# Altium footprint library Sockets.PcbLib: 80 footprints (part 6 of 6)
Each footprint in its own frame and in the unit in brackets; x right, y up, seen from the top. Pads: shape width x height; smd on the part's side, far side on the other; paste and mask are expansions set on the pad; w line width, h text height; cw(c..) or ccw(c..) is an arc to the next point about the centre after c.
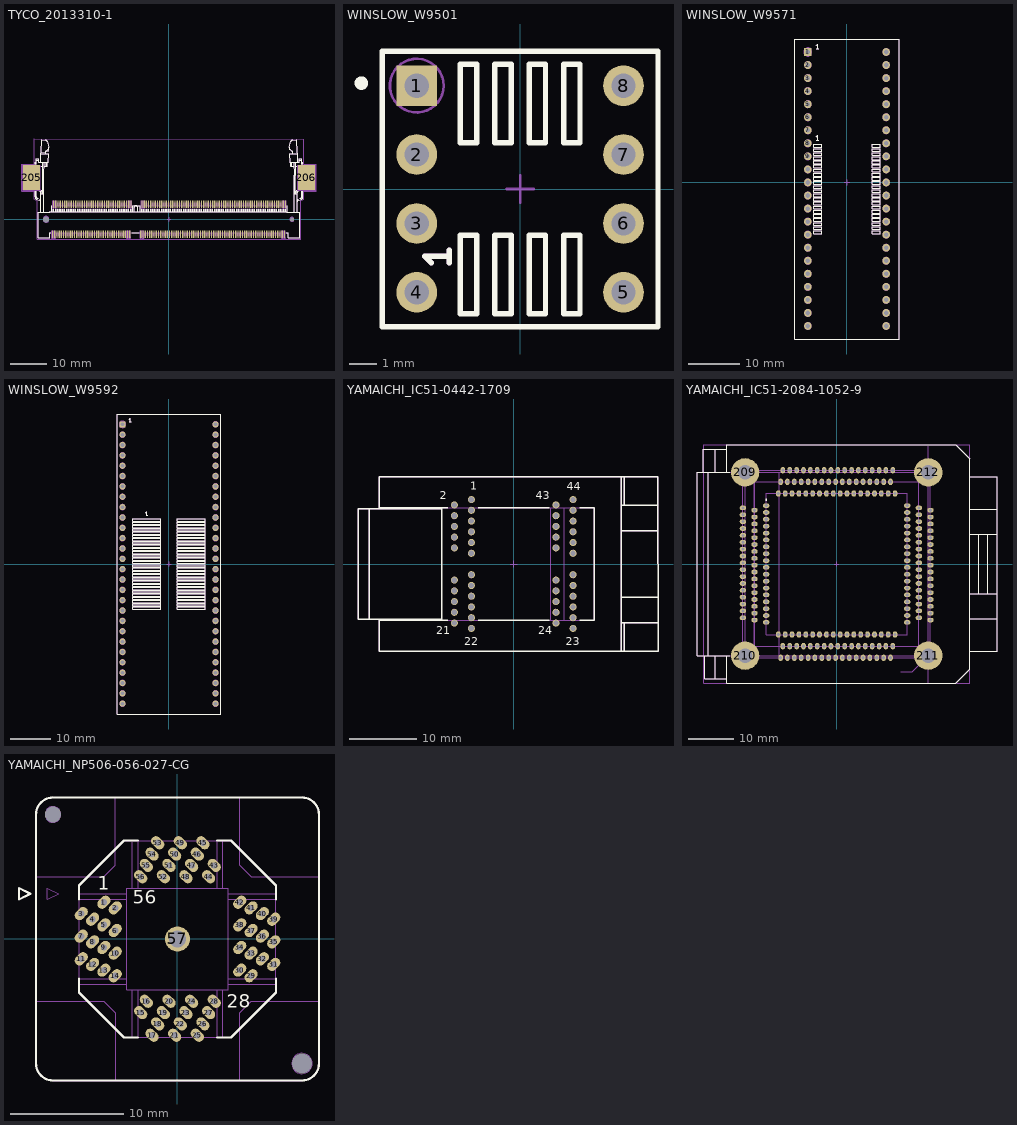
[diagram p5: the footprints below, top view; thin cyan lines are the x and y axes]

## TYCO_2013310-1 [mm] "DDR3 SODIMM Socket 0.6mm Pitch 204 Positions 9.2mm Height"
height 10.2
pads (208):
  rect 0.35x2 smd: 1(-31.65,-4.1) 2(-31.35,4.1) 3(-31.05,-4.1) 4(-30.75,4.1) 5(-30.45,-4.1) 6(-30.15,4.1) 7(-29.85,-4.1) 8(-29.55,4.1) 9(-29.25,-4.1) 10(-28.95,4.1) 11(-28.65,-4.1) 12(-28.35,4.1) 13(-28.05,-4.1) 14(-27.75,4.1) 15(-27.45,-4.1) 16(-27.15,4.1) 17(-26.85,-4.1) 18(-26.55,4.1) 19(-26.25,-4.1) 20(-25.95,4.1) 21(-25.65,-4.1) 22(-25.35,4.1) 23(-25.05,-4.1) 24(-24.75,4.1) 25(-24.45,-4.1) 26(-24.15,4.1) 27(-23.85,-4.1) 28(-23.55,4.1) 29(-23.25,-4.1) 30(-22.95,4.1) 31(-22.65,-4.1) 32(-22.35,4.1) 33(-22.05,-4.1) 34(-21.75,4.1) 35(-21.45,-4.1) 36(-21.15,4.1) 37(-20.85,-4.1) 38(-20.55,4.1) 39(-20.25,-4.1) 40(-19.95,4.1) 41(-19.65,-4.1) 42(-19.35,4.1) 43(-19.05,-4.1) 44(-18.75,4.1) 45(-18.45,-4.1) 46(-18.15,4.1) 47(-17.85,-4.1) 48(-17.55,4.1) 49(-17.25,-4.1) 50(-16.95,4.1) 51(-16.65,-4.1) 52(-16.35,4.1) 53(-16.05,-4.1) 54(-15.75,4.1) 55(-15.45,-4.1) 56(-15.15,4.1) 57(-14.85,-4.1) 58(-14.55,4.1) 59(-14.25,-4.1) 60(-13.95,4.1) 61(-13.65,-4.1) 62(-13.35,4.1) 63(-13.05,-4.1) 64(-12.75,4.1) 65(-12.45,-4.1) 66(-12.15,4.1) 67(-11.85,-4.1) 68(-11.55,4.1) 69(-11.25,-4.1) 70(-10.95,4.1) 71(-10.65,-4.1) 72(-10.35,4.1) 73(-7.65,-4.1) 74(-7.35,4.1) 75(-7.05,-4.1) 76(-6.75,4.1) 77(-6.45,-4.1) 78(-6.15,4.1) 79(-5.85,-4.1) 80(-5.55,4.1) 81(-5.25,-4.1) 82(-4.95,4.1) 83(-4.65,-4.1) 84(-4.35,4.1) 85(-4.05,-4.1) 86(-3.75,4.1) 87(-3.45,-4.1) 88(-3.15,4.1) 89(-2.85,-4.1) 90(-2.55,4.1) 91(-2.25,-4.1) 92(-1.95,4.1) 93(-1.65,-4.1) 94(-1.35,4.1) 95(-1.05,-4.1) 96(-0.75,4.1) 97(-0.45,-4.1) 98(-0.15,4.1) 99(0.15,-4.1) 100(0.45,4.1) 101(0.75,-4.1) 102(1.05,4.1) 103(1.35,-4.1) 104(1.65,4.1) 105(1.95,-4.1) 106(2.25,4.1) 107(2.55,-4.1) 108(2.85,4.1) 109(3.15,-4.1) 110(3.45,4.1) 111(3.75,-4.1) 112(4.05,4.1) 113(4.35,-4.1) 114(4.65,4.1) 115(4.95,-4.1) 116(5.25,4.1) 117(5.55,-4.1) 118(5.85,4.1) 119(6.15,-4.1) 120(6.45,4.1) 121(6.75,-4.1) 122(7.05,4.1) 123(7.35,-4.1) 124(7.65,4.1) 125(7.95,-4.1) 126(8.25,4.1) 127(8.55,-4.1) 128(8.85,4.1) 129(9.15,-4.1) 130(9.45,4.1) 131(9.75,-4.1) 132(10.05,4.1) 133(10.35,-4.1) 134(10.65,4.1) 135(10.95,-4.1) 136(11.25,4.1) 137(11.55,-4.1) 138(11.85,4.1) 139(12.15,-4.1) 140(12.45,4.1) 141(12.75,-4.1) 142(13.05,4.1) 143(13.35,-4.1) 144(13.65,4.1) 145(13.95,-4.1) 146(14.25,4.1) 147(14.55,-4.1) 148(14.85,4.1) 149(15.15,-4.1) 150(15.45,4.1) 151(15.75,-4.1) 152(16.05,4.1) 153(16.35,-4.1) 154(16.65,4.1) 155(16.95,-4.1) 156(17.25,4.1) 157(17.55,-4.1) 158(17.85,4.1) 159(18.15,-4.1) 160(18.45,4.1) 161(18.75,-4.1) 162(19.05,4.1) 163(19.35,-4.1) 164(19.65,4.1) 165(19.95,-4.1) 166(20.25,4.1) 167(20.55,-4.1) 168(20.85,4.1) 169(21.15,-4.1) 170(21.45,4.1) 171(21.75,-4.1) 172(22.05,4.1) 173(22.35,-4.1) 174(22.65,4.1) 175(22.95,-4.1) 176(23.25,4.1) 177(23.55,-4.1) 178(23.85,4.1) 179(24.15,-4.1) 180(24.45,4.1) 181(24.75,-4.1) 182(25.05,4.1) 183(25.35,-4.1) 184(25.65,4.1) 185(25.95,-4.1) 186(26.25,4.1) 187(26.55,-4.1) 188(26.85,4.1) 189(27.15,-4.1) 190(27.45,4.1) 191(27.75,-4.1) 192(28.05,4.1) 193(28.35,-4.1) 194(28.65,4.1) 195(28.95,-4.1) 196(29.25,4.1) 197(29.55,-4.1) 198(29.85,4.1) 199(30.15,-4.1) 200(30.45,4.1) 201(30.75,-4.1) 202(31.05,4.1) 203(31.35,-4.1) 204(31.65,4.1)
  rect 4.7x6.8 smd: 205(-37.35,11.3) 206(37.35,11.3)
  round 0.5 hole 1.6 unplated: 207(-33.4,0)
  round 0.5 hole 1.1 unplated: 208(33.4,0)
Top Overlay:
  drawing of 363 lines, arcs and shapes, not listed
Mechanical 8:
  circle w0.1: c-33.4,0 r0.8
  circle w0.1: c33.4,0 r0.55
  lines w0.1: -37.85,11.3 -37.35,11.3 ; -37.35,10.8 -37.35,11.3 ; -37.35,11.8 -37.35,11.3 ; -36.85,11.3 -37.35,11.3 ; -33.9,0 -33.4,0 ; -33.4,-0.5 -33.4,0 ; -33.4,0.5 -33.4,0 ; -32.9,0 -33.4,0 ; -0.5,0 0,0 ; 0,-0.5 0,0 ; 0,0.5 0,0 ; 0.5,0 0,0 ; 32.9,0 33.4,0 ; 33.4,-0.5 33.4,0 ; 33.4,0.5 33.4,0 ; 33.9,0 33.4,0 ; 36.85,11.3 37.35,11.3 ; 37.35,10.8 37.35,11.3 ; 37.35,11.8 37.35,11.3 ; 37.85,11.3 37.35,11.3 ; -31.825,-5.1 -31.825,-3.1 -31.475,-3.1 -31.475,-5.1 ; -31.825,-5.1 -31.475,-5.1 ; -31.825,-5.1 -31.65,-4.1 -31.475,-5.1 ; -31.525,5.1 -31.35,4.1 -31.175,5.1 ; -31.525,5.1 -31.175,5.1 ; -31.525,5.1 -31.525,3.1 -31.175,3.1 -31.175,5.1 ; -31.225,-5.1 -31.225,-3.1 -30.875,-3.1 -30.875,-5.1 ; -31.225,-5.1 -30.875,-5.1 ; -31.225,-5.1 -31.05,-4.1 -30.875,-5.1 ; -30.925,5.1 -30.75,4.1 -30.575,5.1 ; -30.925,5.1 -30.575,5.1 ; -30.925,5.1 -30.925,3.1 -30.575,3.1 -30.575,5.1 ; -11.425,-5.1 -11.425,-3.1 -11.075,-3.1 -11.075,-5.1 ; -11.425,-5.1 -11.075,-5.1 ; -11.425,-5.1 -11.25,-4.1 -11.075,-5.1 ; -11.125,5.1 -10.95,4.1 -10.775,5.1 ; -11.125,5.1 -10.775,5.1 ; -11.125,5.1 -11.125,3.1 -10.775,3.1 -10.775,5.1 ; -10.825,-5.1 -10.825,-3.1 -10.475,-3.1 -10.475,-5.1 ; -10.825,-5.1 -10.475,-5.1 ; -10.825,-5.1 -10.65,-4.1 -10.475,-5.1 ; -10.525,5.1 -10.35,4.1 -10.175,5.1 ; -10.525,5.1 -10.175,5.1 ; -10.525,5.1 -10.525,3.1 -10.175,3.1 -10.175,5.1 ; -7.825,-5.1 -7.825,-3.1 -7.475,-3.1 -7.475,-5.1 ; -7.825,-5.1 -7.475,-5.1 ; -7.825,-5.1 -7.65,-4.1 -7.475,-5.1 ; -7.525,5.1 -7.35,4.1 -7.175,5.1 ; -7.525,5.1 -7.175,5.1 ; -7.525,5.1 -7.525,3.1 -7.175,3.1 -7.175,5.1 ; -7.225,-5.1 -7.225,-3.1 -6.875,-3.1 -6.875,-5.1 ; -7.225,-5.1 -6.875,-5.1 ; -7.225,-5.1 -7.05,-4.1 -6.875,-5.1 ; -6.925,5.1 -6.75,4.1 -6.575,5.1 ; -6.925,5.1 -6.575,5.1 ; -6.925,5.1 -6.925,3.1 -6.575,3.1 -6.575,5.1 ; 30.575,-5.1 30.575,-3.1 30.925,-3.1 30.925,-5.1 ; 30.575,-5.1 30.925,-5.1 ; 30.575,-5.1 30.75,-4.1 30.925,-5.1 ; 30.875,5.1 31.05,4.1 31.225,5.1 ; 30.875,5.1 31.225,5.1 ; 30.875,5.1 30.875,3.1 31.225,3.1 31.225,5.1 ; 31.175,-5.1 31.175,-3.1 31.525,-3.1 31.525,-5.1 ; 31.175,-5.1 31.525,-5.1 ; 31.175,-5.1 31.35,-4.1 31.525,-5.1 ; 31.475,5.1 31.65,4.1 31.825,5.1 ; 31.475,5.1 31.825,5.1 ; 31.475,5.1 31.475,3.1 31.825,3.1 31.825,5.1 ; -39.7,7.9 -39.7,14.7 -35,14.7 -35,7.9 -39.7,7.9 ; 35,7.9 35,14.7 39.7,14.7 39.7,7.9 35,7.9
Mechanical 14:
  drawing of 1054 lines, arcs and shapes, not listed
Mechanical 15:
  lines w0.05: -39.95,7.65 -39.95,14.95 -36.65,14.95 -36.65,21.817 36.65,21.813 36.65,14.95 39.95,14.95 39.95,7.65 36.65,7.65 36.65,5.456 35.75,5.097 35.75,-5.35 -35.75,-5.35 -35.75,5.097 -36.65,5.456 -36.65,7.65 -39.95,7.65
3D body "TYCO_2013310-1.stp": height 9.45, standoff -0.7, extent -38,-5 38,21.563

## WINSLOW_W9501 [mm] "SOIC 1.27mm Pitch to 8 Leads, Row Spacing 7.62 mm, Pitch 2.54 mm DIP Socket Adapter"
height 3.8
pads (8):
  rect 1.5x1.5 hole 0.9: 1(-3.81,3.81)
  round 1.5 hole 0.9: 2(-3.81,1.27) 3(-3.81,-1.27) 4(-3.81,-3.81) 5(3.81,-3.81) 6(3.81,-1.27) 7(3.81,1.27) 8(3.81,3.81)
Top Overlay:
  circle w0.25: c-5.85,3.9 r0.125
  lines w0.2: -3.271,-2.721 -3.509,-2.482 -2.61,-2.482 ; -2.61,-2.714 -2.61,-2.482 ; -2.61,-2.25 -2.61,-2.482 ; -5.08,-5.08 -5.08,5.08 5.08,5.08 5.08,-5.08 -5.08,-5.08 ; -2.205,-4.6 -2.205,-1.7 -1.605,-1.7 -1.605,-4.6 -2.205,-4.6 ; -2.205,1.7 -2.205,4.6 -1.605,4.6 -1.605,1.7 -2.205,1.7 ; -0.935,-4.6 -0.935,-1.7 -0.335,-1.7 -0.335,-4.6 -0.935,-4.6 ; -0.935,1.7 -0.935,4.6 -0.335,4.6 -0.335,1.7 -0.935,1.7 ; 0.335,-4.6 0.335,-1.7 0.935,-1.7 0.935,-4.6 0.335,-4.6 ; 0.335,1.7 0.935,1.7 0.935,4.6 0.335,4.6 0.335,1.7 ; 1.605,-4.6 1.605,-1.7 2.205,-1.7 2.205,-4.6 1.605,-4.6 ; 1.605,1.7 2.205,1.7 2.205,4.6 1.605,4.6 1.605,1.7
Mechanical 8:
  lines w0.1: -4.31,-3.81 -3.81,-3.81 ; -4.31,-1.27 -3.81,-1.27 ; -4.31,1.27 -3.81,1.27 ; -4.31,3.81 -3.81,3.81 ; -3.81,-4.31 -3.81,-3.81 ; -3.81,-3.31 -3.81,-3.81 ; -3.81,-1.77 -3.81,-1.27 ; -3.81,-0.77 -3.81,-1.27 ; -3.81,0.77 -3.81,1.27 ; -3.81,1.77 -3.81,1.27 ; -3.81,3.31 -3.81,3.81 ; -3.81,4.31 -3.81,3.81 ; -3.31,-3.81 -3.81,-3.81 ; -3.31,-1.27 -3.81,-1.27 ; -3.31,1.27 -3.81,1.27 ; -3.31,3.81 -3.81,3.81 ; -0.5,0 0,0 ; 0,-0.5 0,0 ; 0,0.5 0,0 ; 0.5,0 0,0 ; 3.31,-3.81 3.81,-3.81 ; 3.31,-1.27 3.81,-1.27 ; 3.31,1.27 3.81,1.27 ; 3.31,3.81 3.81,3.81 ; 3.81,-4.31 3.81,-3.81 ; 3.81,-3.31 3.81,-3.81 ; 3.81,-1.77 3.81,-1.27 ; 3.81,-0.77 3.81,-1.27 ; 3.81,0.77 3.81,1.27 ; 3.81,1.77 3.81,1.27 ; 3.81,3.31 3.81,3.81 ; 3.81,4.31 3.81,3.81 ; 4.31,-3.81 3.81,-3.81 ; 4.31,-1.27 3.81,-1.27 ; 4.31,1.27 3.81,1.27 ; 4.31,3.81 3.81,3.81
Mechanical 14:
  circle w0.1: c-3.81,3.81 r0.99
  circle w0.1: c3.81,-3.81 r0.65
  circle w0.1: c3.81,-1.27 r0.65
  circle w0.1: c3.81,1.27 r0.65
  circle w0.1: c3.81,3.81 r0.65
  circle w0.1: c-3.81,3.81 r0.65
  circle w0.1: c-3.81,1.27 r0.65
  circle w0.1: c-3.81,-3.81 r0.65
  circle w0.1: c-3.81,-1.27 r0.65
  lines w0.1: -5.08,-5.08 -5.08,5.08 5.08,5.08 5.08,-5.08 -5.08,-5.08 ; -2.205,-4.6 -2.205,-1.7 -1.605,-1.7 -1.605,-4.6 -2.205,-4.6 ; -2.205,1.7 -2.205,4.6 -1.605,4.6 -1.605,1.7 -2.205,1.7 ; -0.935,-4.6 -0.935,-1.7 -0.335,-1.7 -0.335,-4.6 -0.935,-4.6 ; -0.935,1.7 -0.935,4.6 -0.335,4.6 -0.335,1.7 -0.935,1.7 ; 0.335,-4.6 0.335,-1.7 0.935,-1.7 0.935,-4.6 0.335,-4.6 ; 0.335,1.7 0.935,1.7 0.935,4.6 0.335,4.6 0.335,1.7 ; 1.605,-4.6 1.605,-1.7 2.205,-1.7 2.205,-4.6 1.605,-4.6 ; 1.605,1.7 2.205,1.7 2.205,4.6 1.605,4.6 1.605,1.7
  lines w0.2: -3.271,-2.721 -3.509,-2.482 -2.61,-2.482 ; -2.61,-2.714 -2.61,-2.482 ; -2.61,-2.25 -2.61,-2.482
3D body "WINSLOW_W9501.stp": height 3.73, standoff -3.17, extent -5.08,-5.08 5.08,5.08

## WINSLOW_W9571 [mm] "SOP 44 Pin, Pitch 0.8mm to DiIP 44 Pin, Pitch 2.5mm, Row Spacing 15.24mm, Socket Adapter"
height 3.8
pads (44):
  rect 1.5x1.5 hole 0.9: 1(-7.62,25.4)
  round 1.5 hole 0.9: 2(-7.62,22.86) 3(-7.62,20.32) 4(-7.62,17.78) 5(-7.62,15.24) 6(-7.62,12.7) 7(-7.62,10.16) 8(-7.62,7.62) 9(-7.62,5.08) 10(-7.62,2.54) 11(-7.62,0) 12(-7.62,-2.54) 13(-7.62,-5.08) 14(-7.62,-7.62) 15(-7.62,-10.16) 16(-7.62,-12.7) 17(-7.62,-15.24) 18(-7.62,-17.78) 19(-7.62,-20.32) 20(-7.62,-22.86) 21(-7.62,-25.4) 22(-7.62,-27.94) 23(7.62,-27.94) 24(7.62,-25.4) 25(7.62,-22.86) 26(7.62,-20.32) 27(7.62,-17.78) 28(7.62,-15.24) 29(7.62,-12.7) 30(7.62,-10.16) 31(7.62,-7.62) 32(7.62,-5.08) 33(7.62,-2.54) 34(7.62,0) 35(7.62,2.54) 36(7.62,5.08) 37(7.62,7.62) 38(7.62,10.16) 39(7.62,12.7) 40(7.62,15.24) 41(7.62,17.78) 42(7.62,20.32) 43(7.62,22.86) 44(7.62,25.4)
Top Overlay:
  drawing of 188 lines, arcs and shapes, not listed
Mechanical 8:
  drawing of 180 lines, arcs and shapes, not listed
Mechanical 14:
  drawing of 233 lines, arcs and shapes, not listed
3D body "WINSLOW_W9571.stp": height 3.84, standoff -3.17, extent -10.15,-30.47 10.15,27.93

## WINSLOW_W9592 [mm] "SOP 56 Pin, Pitch 0.8mm to DIP 56 Pin, Pitch 2.54mm, Row Spacing 22.86mm, Socket Adapter"
height 3.8
pads (56):
  rect 1.5x1.5 hole 0.9: 1(-11.43,34.29)
  round 1.5 hole 0.9: 2(-11.43,31.75) 3(-11.43,29.21) 4(-11.43,26.67) 5(-11.43,24.13) 6(-11.43,21.59) 7(-11.43,19.05) 8(-11.43,16.51) 9(-11.43,13.97) 10(-11.43,11.43) 11(-11.43,8.89) 12(-11.43,6.35) 13(-11.43,3.81) 14(-11.43,1.27) 15(-11.43,-1.27) 16(-11.43,-3.81) 17(-11.43,-6.35) 18(-11.43,-8.89) 19(-11.43,-11.43) 20(-11.43,-13.97) 21(-11.43,-16.51) 22(-11.43,-19.05) 23(-11.43,-21.59) 24(-11.43,-24.13) 25(-11.43,-26.67) 26(-11.43,-29.21) 27(-11.43,-31.75) 28(-11.43,-34.29) 29(11.43,-34.29) 30(11.43,-31.75) 31(11.43,-29.21) 32(11.43,-26.67) 33(11.43,-24.13) 34(11.43,-21.59) 35(11.43,-19.05) 36(11.43,-16.51) 37(11.43,-13.97) 38(11.43,-11.43) 39(11.43,-8.89) 40(11.43,-6.35) 41(11.43,-3.81) 42(11.43,-1.27) 43(11.43,1.27) 44(11.43,3.81) 45(11.43,6.35) 46(11.43,8.89) 47(11.43,11.43) 48(11.43,13.97) 49(11.43,16.51) 50(11.43,19.05) 51(11.43,21.59) 52(11.43,24.13) 53(11.43,26.67) 54(11.43,29.21) 55(11.43,31.75) 56(11.43,34.29)
Top Overlay:
  drawing of 236 lines, arcs and shapes, not listed
Mechanical 8:
  drawing of 228 lines, arcs and shapes, not listed
Mechanical 14:
  drawing of 293 lines, arcs and shapes, not listed
3D body "WINSLOW_W9592.stp": height 3.84, standoff -3.17, extent -12.7,-36.83 12.7,36.83

## YAMAICHI_IC51-0442-1709 [mm] "Through Hole Socket for 0.8mm Pitch 44 Pins TSOP"
height 18
pads (44):
  rrect100% 1.05x1.05 hole 0.8 unplated: 1(-6.3,9.6) 2(-8.84,8.8) 3(-6.3,8) 4(-8.84,7.2) 5(-6.3,6.4) 6(-8.84,5.6) 7(-6.3,4.8) 8(-8.84,4) 9(-6.3,3.2) 10(-8.84,2.4) 11(-6.3,1.6) 12(-6.3,-1.6) 13(-8.84,-2.4) 14(-6.3,-3.2) 15(-8.84,-4) 16(-6.3,-4.8) 17(-8.84,-5.6) 18(-6.3,-6.4) 19(-8.84,-7.2) 20(-6.3,-8) 21(-8.84,-8.8) 22(-6.3,-9.6) 23(8.84,-9.6) 24(6.3,-8.8) 25(8.84,-8) 26(6.3,-7.2) 27(8.84,-6.4) 28(6.3,-5.6) 29(8.84,-4.8) 30(6.3,-4) 31(8.84,-3.2) 32(6.3,-2.4) 33(8.84,-1.6) 34(8.84,1.6) 35(6.3,2.4) 36(8.84,3.2) 37(6.3,4) 38(8.84,4.8) 39(6.3,5.6) 40(8.84,6.4) 41(6.3,7.2) 42(8.84,8) 43(6.3,8.8) 44(8.84,9.6)
Top Overlay:
  lines w0.2: -21.5,-8.2 -21.5,8.2 ; -20,-8.4 -9.84,-8.4 ; -20,-8.2 -20,-13 21.5,-13 21.5,13 -20,13 -20,8.2 ; -20,8.4 -9.84,8.4 ; -5.3,-8.4 5.3,-8.4 ; -5.3,8.4 5.3,8.4 ; 9.84,-8.4 12,-8.4 12,8.4 9.84,8.4 ; 16,-13 16,13 ; 16,-8.75 21.489,-8.75 ; 16,-4.95 21.5,-4.95 ; 16.5,-13 16.5,-8.8 ; 16.5,8.8 16.5,13 ; -23.2,-8.2 -10.7,-8.2 -10.7,8.2 -23.2,8.2 -23.2,-8.2 ; 16,4.95 21.5,4.95 16,4.95 ; 16,8.75 21.5,8.75 16,8.75
  text "1" at -6.46,11.03 h1.2
  text "2" at -11.035,9.68 h1.2
  text "43" at 3.265,9.63 h1.2
  text "44" at 7.89,10.98 h1.2
  text "21" at -11.51,-10.495 h1.2
  text "22" at -7.36,-12.07 h1.2
  text "23" at 7.78,-12.07 h1.2
  text "24" at 3.63,-10.495 h1.2
Mechanical 8:
  drawing of 180 lines, arcs and shapes, not listed
Mechanical 14:
  lines w0.1: -21.5,-8.2 -21.5,8.2 ; -20,-8.4 12,-8.4 12,8.4 -20,8.4 ; -20,-8.2 -20,-13 21.5,-13 21.5,13 -20,13 -20,8.2 ; 5.5,-8.4 5.5,8.4 ; 7.5,-8.4 7.5,8.4 ; 16,-13 16,13 ; 16,-8.75 21.489,-8.75 ; 16,-4.95 21.5,-4.95 ; 16.5,-13 16.5,-8.8 ; 16.5,8.8 16.5,13 ; -23.2,-8.2 -10.7,-8.2 -10.7,8.2 -23.2,8.2 -23.2,-8.2 ; 16,4.95 21.5,4.95 16,4.95 ; 16,8.75 21.5,8.75 16,8.75
  text "1" at -6.46,11.03 h1.2
  text "2" at -11.035,9.68 h1.2
  text "43" at 3.265,9.63 h1.2
  text "44" at 7.89,10.98 h1.2
  text "21" at -11.51,-10.495 h1.2
  text "22" at -7.36,-12.07 h1.2
  text "23" at 7.78,-12.07 h1.2
  text "24" at 3.63,-10.495 h1.2
3D body "YAMAICHI_IC51-0442-1709.stp": height 18, standoff -2.9, extent -23.2,-13 21.5,13
3D body "YAMAICHI_IC51-0442-1709.stp": height 18, standoff 0, extent -23.2,-13 21.5,13

## YAMAICHI_IC51-2084-1052-9 [mm] "Through Hole Socket for 0.5mm Pitch 208 Pins QFP, Body 58 x52mm"
height 18.5
pads (212):
  oval 1.4x1 hole 0.7: 1(-15.4,12.75) 2(-20.48,12.25) 3(-17.94,11.75) 4(-15.4,11.25) 5(-20.48,10.75) 6(-17.94,10.25) 7(-15.4,9.75) 8(-20.48,9.25) 9(-17.94,8.75) 10(-15.4,8.25) 11(-20.48,7.75) 12(-17.94,7.25) 13(-15.4,6.75) 14(-20.48,6.25) 15(-17.94,5.75) 16(-15.4,5.25) 17(-20.48,4.75) 18(-17.94,4.25) 19(-15.4,3.75) 20(-20.48,3.25) 21(-17.94,2.75) 22(-15.4,2.25) 23(-20.48,1.75) 24(-17.94,1.25) 25(-15.4,0.75) 26(-20.48,0.25) 27(-17.94,-0.25) 28(-15.4,-0.75) 29(-20.48,-1.25) 30(-17.94,-1.75) 31(-15.4,-2.25) 32(-20.48,-2.75) 33(-17.94,-3.25) 34(-15.4,-3.75) 35(-20.48,-4.25) 36(-17.94,-4.75) 37(-15.4,-5.25) 38(-20.48,-5.75) 39(-17.94,-6.25) 40(-15.4,-6.75) 41(-20.48,-7.25) 42(-17.94,-7.75) 43(-15.4,-8.25) 44(-20.48,-8.75) 45(-17.94,-9.25) 46(-15.4,-9.75) 47(-20.48,-10.25) 48(-17.94,-10.75) 49(-15.4,-11.25) 50(-20.48,-11.75) 51(-17.94,-12.25) 52(-15.4,-12.75) 105(15.4,-12.75) 106(20.48,-12.25) 107(17.94,-11.75) 108(15.4,-11.25) 109(20.48,-10.75) 110(17.94,-10.25) 111(15.4,-9.75) 112(20.48,-9.25) 113(17.94,-8.75) 114(15.4,-8.25) 115(20.48,-7.75) 116(17.94,-7.25) 117(15.4,-6.75) 118(20.48,-6.25) 119(17.94,-5.75) 120(15.4,-5.25) 121(20.48,-4.75) 122(17.94,-4.25) 123(15.4,-3.75) 124(20.48,-3.25) 125(17.94,-2.75) 126(15.4,-2.25) 127(20.48,-1.75) 128(17.94,-1.25) 129(15.4,-0.75) 130(20.48,-0.25) 131(17.94,0.25) 132(15.4,0.75) 133(20.48,1.25) 134(17.94,1.75) 135(15.4,2.25) 136(20.48,2.75) 137(17.94,3.25) 138(15.4,3.75) 139(20.48,4.25) 140(17.94,4.75) 141(15.4,5.25) 142(20.48,5.75) 143(17.94,6.25) 144(15.4,6.75) 145(20.48,7.25) 146(17.94,7.75) 147(15.4,8.25) 148(20.48,8.75) 149(17.94,9.25) 150(15.4,9.75) 151(20.48,10.25) 152(17.94,10.75) 153(15.4,11.25) 154(20.48,11.75) 155(17.94,12.25) 156(15.4,12.75)
  oval 1x1.4 hole 0.7: 53(-12.75,-15.4) 54(-12.25,-20.48) 55(-11.75,-17.94) 56(-11.25,-15.4) 57(-10.75,-20.48) 58(-10.25,-17.94) 59(-9.75,-15.4) 60(-9.25,-20.48) 61(-8.75,-17.94) 62(-8.25,-15.4) 63(-7.75,-20.48) 64(-7.25,-17.94) 65(-6.75,-15.4) 66(-6.25,-20.48) 67(-5.75,-17.94) 68(-5.25,-15.4) 69(-4.75,-20.48) 70(-4.25,-17.94) 71(-3.75,-15.4) 72(-3.25,-20.48) 73(-2.75,-17.94) 74(-2.25,-15.4) 75(-1.75,-20.48) 76(-1.25,-17.94) 77(-0.75,-15.4) 78(-0.25,-20.48) 79(0.25,-17.94) 80(0.75,-15.4) 81(1.25,-20.48) 82(1.75,-17.94) 83(2.25,-15.4) 84(2.75,-20.48) 85(3.25,-17.94) 86(3.75,-15.4) 87(4.25,-20.48) 88(4.75,-17.94) 89(5.25,-15.4) 90(5.75,-20.48) 91(6.25,-17.94) 92(6.75,-15.4) 93(7.25,-20.48) 94(7.75,-17.94) 95(8.25,-15.4) 96(8.75,-20.48) 97(9.25,-17.94) 98(9.75,-15.4) 99(10.25,-20.48) 100(10.75,-17.94) 101(11.25,-15.4) 102(11.75,-20.48) 103(12.25,-17.94) 104(12.75,-15.4) 157(12.75,15.4) 158(12.25,20.48) 159(11.75,17.94) 160(11.25,15.4) 161(10.75,20.48) 162(10.25,17.94) 163(9.75,15.4) 164(9.25,20.48) 165(8.75,17.94) 166(8.25,15.4) 167(7.75,20.48) 168(7.25,17.94) 169(6.75,15.4) 170(6.25,20.48) 171(5.75,17.94) 172(5.25,15.4) 173(4.75,20.48) 174(4.25,17.94) 175(3.75,15.4) 176(3.25,20.48) 177(2.75,17.94) 178(2.25,15.4) 179(1.75,20.48) 180(1.25,17.94) 181(0.75,15.4) 182(0.25,20.48) 183(-0.25,17.94) 184(-0.75,15.4) 185(-1.25,20.48) 186(-1.75,17.94) 187(-2.25,15.4) 188(-2.75,20.48) 189(-3.25,17.94) 190(-3.75,15.4) 191(-4.25,20.48) 192(-4.75,17.94) 193(-5.25,15.4) 194(-5.75,20.48) 195(-6.25,17.94) 196(-6.75,15.4) 197(-7.25,20.48) 198(-7.75,17.94) 199(-8.25,15.4) 200(-8.75,20.48) 201(-9.25,17.94) 202(-9.75,15.4) 203(-10.25,20.48) 204(-10.75,17.94) 205(-11.25,15.4) 206(-11.75,20.48) 207(-12.25,17.94) 208(-12.75,15.4)
  round 6.2 hole 3.2: 209(-20,20) 210(-20,-20) 211(20,-20) 212(20,20)
Top Overlay:
  circle w0.25: c-15.375,14.06 r0.125
  lines w0.2: -29.112,20 -29.112,25 -24,25 ; -28.838,-20 -28.838,-25 -24,-25 ; -27.997,-20 -27.997,20 ; -26.5,-25 -26.5,-20 ; -26.5,20 -26.5,25 ; -24,-20 -24,-26 26,-26 29,-23 29,23 26,26 -24,26 -24,20 ; -23.4,-20 -30.5,-20 -30.5,20 -23.4,20 ; 29,-19 35,-19 35,19 29,19 ; 29,-12 35,-12 ; 29,-6.5 35,-6.5 ; 29,6.5 35,6.5 ; 29,12 35,12 ; 31,-6.5 31,6.5 ; 33,-6.5 33,6.5
Mechanical 8:
  drawing of 874 lines, arcs and shapes, not listed
  text "Fixing Screw Standoff Height = 4mm" at -5.715,-23.495 h0.6
Mechanical 14:
  lines w0.1: -29.112,20 -29.112,25 -24,25 ; -28.838,-20 -28.838,-25 -24,-25 ; -27.997,-20 -27.997,20 ; -26.5,-25 -26.5,-20 ; -26.5,20 -26.5,25 ; -24,-20 -24,-26 26,-26 29,-23 29,23 26,26 -24,26 -24,20 ; -18.017,-20 -18.017,20 ; 20,-26 20,26 ; 29,-19 35,-19 35,19 29,19 ; 29,-12 35,-12 ; 29,-6.5 35,-6.5 ; 29,6.5 35,6.5 ; 29,12 35,12 ; 31,-6.5 31,6.5 ; 33,-6.5 33,6.5 ; -30.5,-20 -12.5,-20 -12.5,20 -30.5,20 -30.5,-20
3D body "YAMAICHI_IC51-2084-1052-9.stp": height 18.5, standoff -2.5, extent -30.5,-26 35,26

## YAMAICHI_NP506-056-027-CG [mm] "Through Hole Socket for 0.5mm Pitch 56 Pins QFN, Body 25 x25mm"
height 18.5
pads (59):
  oval 0.85x1.3 hole 0.55 rot 135: 1(-6.5,3.25) 2(-5.5,2.75) 3(-8.5,2.25) 4(-7.5,1.75) 5(-6.5,1.25) 6(-5.5,0.75) 7(-8.5,0.25) 8(-7.5,-0.25) 9(-6.5,-0.75) 10(-5.5,-1.25) 11(-8.5,-1.75) 12(-7.5,-2.25) 13(-6.5,-2.75) 14(-5.5,-3.25) 29(6.5,-3.25) 30(5.5,-2.75) 31(8.5,-2.25) 32(7.5,-1.75) 33(6.5,-1.25) 34(5.5,-0.75) 35(8.5,-0.25) 36(7.5,0.25) 37(6.5,0.75) 38(5.5,1.25) 39(8.5,1.75) 40(7.5,2.25) 41(6.5,2.75) 42(5.5,3.25)
  oval 0.85x1.3 hole 0.55 rot 45: 15(-3.25,-6.5) 16(-2.75,-5.5) 17(-2.25,-8.5) 18(-1.75,-7.5) 19(-1.25,-6.5) 20(-0.75,-5.5) 21(-0.25,-8.5) 22(0.25,-7.5) 23(0.75,-6.5) 24(1.25,-5.5) 25(1.75,-8.5) 26(2.25,-7.5) 27(2.75,-6.5) 28(3.25,-5.5) 43(3.25,6.5) 44(2.75,5.5) 45(2.25,8.5) 46(1.75,7.5) 47(1.25,6.5) 48(0.75,5.5) 49(0.25,8.5) 50(-0.25,7.5) 51(-0.75,6.5) 52(-1.25,5.5) 53(-1.75,8.5) 54(-2.25,7.5) 55(-2.75,6.5) 56(-3.25,5.5)
  round 2.2 hole 1.5: 57(0,0)
  round 0.5 hole 1.4 unplated: 58(-11,11)
  round 0.5 hole 1.8 unplated: 59(11,-11)
Top Overlay:
  lines w0.2: -8.7,-3.5 -8.7,-4.735 -4.735,-8.7 -3.5,-8.7 ; -8.7,3.5 -8.7,4.735 -4.735,8.7 -3.5,8.7 ; 3.5,-8.7 4.735,-8.7 8.7,-4.735 8.7,-3.5 ; 3.5,8.7 4.735,8.7 8.7,4.735 8.7,3.5 ; -14,3.5 -14,4.5 -13,4 -14,3.5 ; -12.5,-11 ccw(c-11,-11) -11,-12.5 11,-12.5 ccw(c11,-11) 12.5,-11 12.5,11 ccw(c11,11) 11,12.5 -11,12.5 ccw(c-11,11) -12.5,11 -12.5,-11
  text "28" at 4.365,-6.07 h1.2
  text "1" at -7.035,4.355 h1.2
  text "56" at -3.96,3.105 h1.2
Mechanical 8:
  drawing of 263 lines, arcs and shapes, not listed
Mechanical 14:
  lines w0.1: -8.7,-4 -4.5,-4 ; -8.7,-3.5 -4.5,-3.5 ; -8.7,3.5 -4.5,3.5 ; -8.7,4 -4.5,4 ; -4,-8.7 -4,-4.5 ; -4,4.5 -4,8.7 ; -3.5,-8.7 -3.5,-4.5 ; -3.5,4.5 -3.5,8.7 ; 3.5,-8.7 3.5,-4.5 ; 3.5,4.5 3.5,8.7 ; 4,-8.7 4,-4.5 ; 4,4.5 4,8.7 ; 4.5,-4 8.7,-4 ; 4.5,-3.5 8.7,-3.5 ; 4.5,3.5 8.7,3.5 ; 4.5,4 8.7,4 ; -12.5,-11 ccw(c-11,-11) -11,-12.5 11,-12.5 ccw(c11,-11) 12.5,-11 12.5,11 ccw(c11,11) 11,12.5 -11,12.5 ccw(c-11,11) -12.5,11 -12.5,-11 ; -11.5,3.5 -11.5,4.5 -10.5,4 -11.5,3.5 ; -8.7,-4.735 -4.735,-8.7 4.735,-8.7 8.7,-4.735 8.7,4.735 4.735,8.7 -4.735,8.7 -8.7,4.735 -8.7,-4.735 ; -4.5,-4.5 -4.5,4.5 4.5,4.5 4.5,-4.5 -4.5,-4.5
  text "28" at 4.365,-6.07 h1.2
  text "1" at -7.035,4.355 h1.2
  text "56" at -3.96,3.105 h1.2
3D body "YAMAICHI_NP506-056-027-CG.stp": height 18.5, standoff -3, extent -12.5,-12.5 12.5,12.5